# Altium footprint library milandr.PcbLib: 4 footprints
Each footprint in its own frame and in the unit in brackets; x right, y up, seen from the top. Pads: shape width x height; smd on the part's side, far side on the other; paste and mask are expansions set on the pad; w line width, h text height; cw(c..) or ccw(c..) is an arc to the next point about the centre after c.
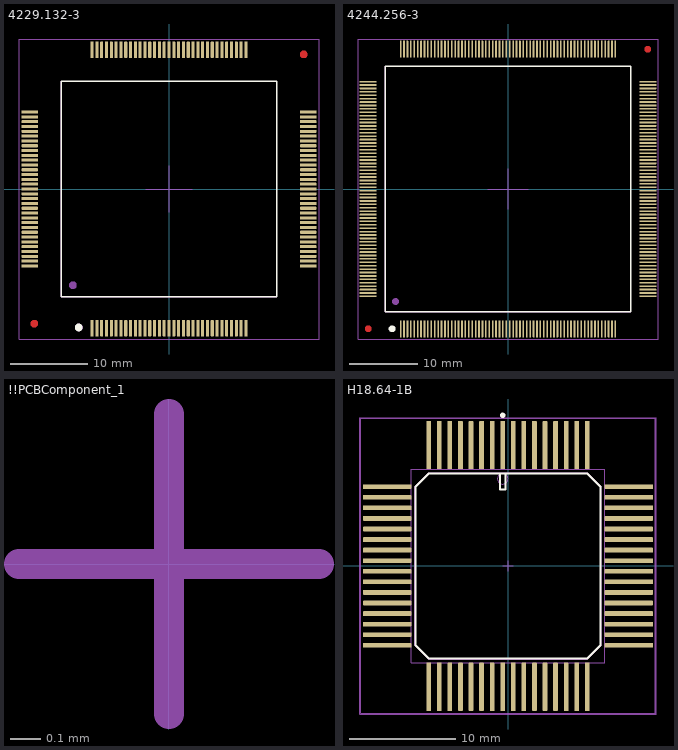
[diagram p0: the footprints below, top view; thin cyan lines are the x and y axes]

## 4229.132-3 [mm] "1986ВЕ1Т_4229.132-3"
height 3.06
pads (132):
  rrect20% 0.4x2.1 smd: 1(-10,-18.1) 2(-9.375,-18.1) 3(-8.75,-18.1) 4(-8.125,-18.1) 5(-7.5,-18.1) 6(-6.875,-18.1) 7(-6.25,-18.1) 8(-5.625,-18.1) 9(-5,-18.1) 10(-4.375,-18.1) 11(-3.75,-18.1) 12(-3.125,-18.1) 13(-2.5,-18.1) 14(-1.875,-18.1) 15(-1.25,-18.1) 16(-0.625,-18.1) 17(0,-18.1) 18(0.625,-18.1) 19(1.25,-18.1) 20(1.875,-18.1) 21(2.5,-18.1) 22(3.125,-18.1) 23(3.75,-18.1) 24(4.375,-18.1) 25(5,-18.1) 26(5.625,-18.1) 27(6.25,-18.1) 28(6.875,-18.1) 29(7.5,-18.1) 30(8.125,-18.1) 31(8.75,-18.1) 32(9.375,-18.1) 33(10,-18.1) 67(10,18.1) 68(9.375,18.1) 69(8.75,18.1) 70(8.125,18.1) 71(7.5,18.1) 72(6.875,18.1) 73(6.25,18.1) 74(5.625,18.1) 75(5,18.1) 76(4.375,18.1) 77(3.75,18.1) 78(3.125,18.1) 79(2.5,18.1) 80(1.875,18.1) 81(1.25,18.1) 82(0.625,18.1) 83(0,18.1) 84(-0.625,18.1) 85(-1.25,18.1) 86(-1.875,18.1) 87(-2.5,18.1) 88(-3.125,18.1) 89(-3.75,18.1) 90(-4.375,18.1) 91(-5,18.1) 92(-5.625,18.1) 93(-6.25,18.1) 94(-6.875,18.1) 95(-7.5,18.1) 96(-8.125,18.1) 97(-8.75,18.1) 98(-9.375,18.1) 99(-10,18.1)
  rrect20% 2.1x0.4 smd: 34(18.1,-10) 35(18.1,-9.375) 36(18.1,-8.75) 37(18.1,-8.125) 38(18.1,-7.5) 39(18.1,-6.875) 40(18.1,-6.25) 41(18.1,-5.625) 42(18.1,-5) 43(18.1,-4.375) 44(18.1,-3.75) 45(18.1,-3.125) 46(18.1,-2.5) 47(18.1,-1.875) 48(18.1,-1.25) 49(18.1,-0.625) 50(18.1,0) 51(18.1,0.625) 52(18.1,1.25) 53(18.1,1.875) 54(18.1,2.5) 55(18.1,3.125) 56(18.1,3.75) 57(18.1,4.375) 58(18.1,5) 59(18.1,5.625) 60(18.1,6.25) 61(18.1,6.875) 62(18.1,7.5) 63(18.1,8.125) 64(18.1,8.75) 65(18.1,9.375) 66(18.1,10) 100(-18.1,10) 101(-18.1,9.375) 102(-18.1,8.75) 103(-18.1,8.125) 104(-18.1,7.5) 105(-18.1,6.875) 106(-18.1,6.25) 107(-18.1,5.625) 108(-18.1,5) 109(-18.1,4.375) 110(-18.1,3.75) 111(-18.1,3.125) 112(-18.1,2.5) 113(-18.1,1.875) 114(-18.1,1.25) 115(-18.1,0.625) 116(-18.1,0) 117(-18.1,-0.625) 118(-18.1,-1.25) 119(-18.1,-1.875) 120(-18.1,-2.5) 121(-18.1,-3.125) 122(-18.1,-3.75) 123(-18.1,-4.375) 124(-18.1,-5) 125(-18.1,-5.625) 126(-18.1,-6.25) 127(-18.1,-6.875) 128(-18.1,-7.5) 129(-18.1,-8.125) 130(-18.1,-8.75) 131(-18.1,-9.375) 132(-18.1,-10)
Top Layer:
  circle w0.5: c-17.5,-17.5 r0.25
  circle w0.5: c17.5,17.5 r0.25
Top Overlay:
  circle w0.5: c-11.75,-18 r0.25
  lines w0.2: -14,-14 14,-14 14,14 -14,14 -14,-14
Top Solder:
  circle w1: c17.5,17.5 r0.5
  circle w1: c-17.5,-17.5 r0.5
M3_comm_top:
  text ".comment" at -1.7,-0.2 h1
M5_asm_top:
  circle w0.2: c-11.7,-18 r0.4
  lines w0.1: -14,-14 14,-14 14,14 -14,14 -14,-14
  text ".Designator" at -1.2,19.5 h1
M7_courtyard_top:
  lines w0.1: -0.5,0 0.5,0 ; 0,-0.5 0,0.5 ; -19.5,-19.5 -19.5,19.5 19.5,19.5 19.5,-19.5 -19.5,-19.5
Mechanical 13:
  circle w0.5: c-12.5,-12.5 r0.25
  lines w0.1: -14,-14 -14,14 14,14 14,-14 -14,-14
Mechanical 15:
  lines w0.1: -3,0 3,0 ; 0,-3 0,3 ; -19.5,-19.5 -19.5,19.5 19.5,19.5 19.5,-19.5 -19.5,-19.5
3D body "4229.132-3(Удлинненые ноги+логотип миландра).STEP": height 4.52, standoff 0, extent -18.5,-18.5 18.5,18.5

## 4244.256-3 [mm] "1986BE8T"
height 3.06
pads (256):
  rrect20% 0.25x2.5 smd: 1(-15.75,-20.5) 2(-15.25,-20.5) 3(-14.75,-20.5) 4(-14.25,-20.5) 5(-13.75,-20.5) 6(-13.25,-20.5) 7(-12.75,-20.5) 8(-12.25,-20.5) 9(-11.75,-20.5) 10(-11.25,-20.5) 11(-10.75,-20.5) 12(-10.25,-20.5) 13(-9.75,-20.5) 14(-9.25,-20.5) 15(-8.75,-20.5) 16(-8.25,-20.5) 17(-7.75,-20.5) 18(-7.25,-20.5) 19(-6.75,-20.5) 20(-6.25,-20.5) 21(-5.75,-20.5) 22(-5.25,-20.5) 23(-4.75,-20.5) 24(-4.25,-20.5) 25(-3.75,-20.5) 26(-3.25,-20.5) 27(-2.75,-20.5) 28(-2.25,-20.5) 29(-1.75,-20.5) 30(-1.25,-20.5) 31(-0.75,-20.5) 32(-0.25,-20.5) 33(0.25,-20.5) 34(0.75,-20.5) 35(1.25,-20.5) 36(1.75,-20.5) 37(2.25,-20.5) 38(2.75,-20.5) 39(3.25,-20.5) 40(3.75,-20.5) 41(4.25,-20.5) 42(4.75,-20.5) 43(5.25,-20.5) 44(5.75,-20.5) 45(6.25,-20.5) 46(6.75,-20.5) 47(7.25,-20.5) 48(7.75,-20.5) 49(8.25,-20.5) 50(8.75,-20.5) 51(9.25,-20.5) 52(9.75,-20.5) 53(10.25,-20.5) 54(10.75,-20.5) 55(11.25,-20.5) 56(11.75,-20.5) 57(12.25,-20.5) 58(12.75,-20.5) 59(13.25,-20.5) 60(13.75,-20.5) 61(14.25,-20.5) 62(14.75,-20.5) 63(15.25,-20.5) 64(15.75,-20.5) 129(15.75,20.5) 130(15.25,20.5) 131(14.75,20.5) 132(14.25,20.5) 133(13.75,20.5) 134(13.25,20.5) 135(12.75,20.5) 136(12.25,20.5) 137(11.75,20.5) 138(11.25,20.5) 139(10.75,20.5) 140(10.25,20.5) 141(9.75,20.5) 142(9.25,20.5) 143(8.75,20.5) 144(8.25,20.5) 145(7.75,20.5) 146(7.25,20.5) 147(6.75,20.5) 148(6.25,20.5) 149(5.75,20.5) 150(5.25,20.5) 151(4.75,20.5) 152(4.25,20.5) 153(3.75,20.5) 154(3.25,20.5) 155(2.75,20.5) 156(2.25,20.5) 157(1.75,20.5) 158(1.25,20.5) 159(0.75,20.5) 160(0.25,20.5) 161(-0.25,20.5) 162(-0.75,20.5) 163(-1.25,20.5) 164(-1.75,20.5) 165(-2.25,20.5) 166(-2.75,20.5) 167(-3.25,20.5) 168(-3.75,20.5) 169(-4.25,20.5) 170(-4.75,20.5) 171(-5.25,20.5) 172(-5.75,20.5) 173(-6.25,20.5) 174(-6.75,20.5) 175(-7.25,20.5) 176(-7.75,20.5) 177(-8.25,20.5) 178(-8.75,20.5) 179(-9.25,20.5) 180(-9.75,20.5) 181(-10.25,20.5) 182(-10.75,20.5) 183(-11.25,20.5) 184(-11.75,20.5) 185(-12.25,20.5) 186(-12.75,20.5) 187(-13.25,20.5) 188(-13.75,20.5) 189(-14.25,20.5) 190(-14.75,20.5) 191(-15.25,20.5) 192(-15.75,20.5)
  rrect20% 2.5x0.25 smd: 65(20.5,-15.75) 66(20.5,-15.25) 67(20.5,-14.75) 68(20.5,-14.25) 69(20.5,-13.75) 70(20.5,-13.25) 71(20.5,-12.75) 72(20.5,-12.25) 73(20.5,-11.75) 74(20.5,-11.25) 75(20.5,-10.75) 76(20.5,-10.25) 77(20.5,-9.75) 78(20.5,-9.25) 79(20.5,-8.75) 80(20.5,-8.25) 81(20.5,-7.75) 82(20.5,-7.25) 83(20.5,-6.75) 84(20.5,-6.25) 85(20.5,-5.75) 86(20.5,-5.25) 87(20.5,-4.75) 88(20.5,-4.25) 89(20.5,-3.75) 90(20.5,-3.25) 91(20.5,-2.75) 92(20.5,-2.25) 93(20.5,-1.75) 94(20.5,-1.25) 95(20.5,-0.75) 96(20.5,-0.25) 97(20.5,0.25) 98(20.5,0.75) 99(20.5,1.25) 100(20.5,1.75) 101(20.5,2.25) 102(20.5,2.75) 103(20.5,3.25) 104(20.5,3.75) 105(20.5,4.25) 106(20.5,4.75) 107(20.5,5.25) 108(20.5,5.75) 109(20.5,6.25) 110(20.5,6.75) 111(20.5,7.25) 112(20.5,7.75) 113(20.5,8.25) 114(20.5,8.75) 115(20.5,9.25) 116(20.5,9.75) 117(20.5,10.25) 118(20.5,10.75) 119(20.5,11.25) 120(20.5,11.75) 121(20.5,12.25) 122(20.5,12.75) 123(20.5,13.25) 124(20.5,13.75) 125(20.5,14.25) 126(20.5,14.75) 127(20.5,15.25) 128(20.5,15.75) 193(-20.5,15.75) 194(-20.5,15.25) 195(-20.5,14.75) 196(-20.5,14.25) 197(-20.5,13.75) 198(-20.5,13.25) 199(-20.5,12.75) 200(-20.5,12.25) 201(-20.5,11.75) 202(-20.5,11.25) 203(-20.5,10.75) 204(-20.5,10.25) 205(-20.5,9.75) 206(-20.5,9.25) 207(-20.5,8.75) 208(-20.5,8.25) 209(-20.5,7.75) 210(-20.5,7.25) 211(-20.5,6.75) 212(-20.5,6.25) 213(-20.5,5.75) 214(-20.5,5.25) 215(-20.5,4.75) 216(-20.5,4.25) 217(-20.5,3.75) 218(-20.5,3.25) 219(-20.5,2.75) 220(-20.5,2.25) 221(-20.5,1.75) 222(-20.5,1.25) 223(-20.5,0.75) 224(-20.5,0.25) 225(-20.5,-0.25) 226(-20.5,-0.75) 227(-20.5,-1.25) 228(-20.5,-1.75) 229(-20.5,-2.25) 230(-20.5,-2.75) 231(-20.5,-3.25) 232(-20.5,-3.75) 233(-20.5,-4.25) 234(-20.5,-4.75) 235(-20.5,-5.25) 236(-20.5,-5.75) 237(-20.5,-6.25) 238(-20.5,-6.75) 239(-20.5,-7.25) 240(-20.5,-7.75) 241(-20.5,-8.25) 242(-20.5,-8.75) 243(-20.5,-9.25) 244(-20.5,-9.75) 245(-20.5,-10.25) 246(-20.5,-10.75) 247(-20.5,-11.25) 248(-20.5,-11.75) 249(-20.5,-12.25) 250(-20.5,-12.75) 251(-20.5,-13.25) 252(-20.5,-13.75) 253(-20.5,-14.25) 254(-20.5,-14.75) 255(-20.5,-15.25) 256(-20.5,-15.75)
Top Layer:
  circle w0.5: c-20.5,-20.5 r0.25
  circle w0.5: c20.5,20.5 r0.25
Top Overlay:
  circle w0.5: c-17,-20.5 r0.25
  circle w0.5: c-17,-20.5 r0.25
  lines w0.2: -18,-18 -18,18 18,18 18,-18 -18,-18
Top Solder:
  circle w1: c-20.5,-20.5 r0.5
  circle w1: c20.5,20.5 r0.5
M3_comm_top:
  text ".comment" at -1.7,-0.2 h1
M5_asm_top:
  circle w0.2: c-17,-20.5 r0.316
  lines w0.1: -18,-18 -18,18 18,18 18,-18 -18,-18
  text ".Designator" at -1.5,22.2 h1
M7_courtyard_top:
  lines w0.1: -0.5,0 0.5,0 ; 0,-0.5 0,0.5 ; -22,-22 22,-22 22,22 -22,22 -22,-22
Mechanical 13:
  circle w0.5: c-16.5,-16.5 r0.25
  lines w0.1: -18,-18 18,-18 18,18 -18,18 -18,-18
Mechanical 15:
  lines w0.1: -3,0 3,0 ; 0,-3 0,3 ; -22,-22 22,-22 22,22 -22,22 -22,-22
3D body "4244_256-3.step": height 3.26, standoff 0, extent -21.382,-21.417 21.418,21.383

## !!PCBComponent_1 [mm]
M3_comm_top:
  text ".comment" at -3,-0.5 h2
M5_asm_top:
  text ".Designator" at -2,5.5 h2
M7_courtyard_top:
  lines w0.1: -0.5,0 0.5,0 ; 0,-0.5 0,0.5

## H18.64-1B [mm] "1986ВЕ92У, CQFP, 64-Leads, Body 26,60x26,60mm, Pitch 1,00mm, IPC Medium Density"
height 3
pads (64):
  rrect20% 0.45x4.55 smd: 1(-0.5,11.425) 2(-1.5,11.425) 3(-2.5,11.425) 4(-3.5,11.425) 5(-4.5,11.425) 6(-5.5,11.425) 7(-6.5,11.425) 8(-7.5,11.425) 25(-7.5,-11.425) 26(-6.5,-11.425) 27(-5.5,-11.425) 28(-4.5,-11.425) 29(-3.5,-11.425) 30(-2.5,-11.425) 31(-1.5,-11.425) 32(-0.5,-11.425) 33(0.5,-11.425) 34(1.5,-11.425) 35(2.5,-11.425) 36(3.5,-11.425) 37(4.5,-11.425) 38(5.5,-11.425) 39(6.5,-11.425) 40(7.5,-11.425) 57(7.5,11.425) 58(6.5,11.425) 59(5.5,11.425) 60(4.5,11.425) 61(3.5,11.425) 62(2.5,11.425) 63(1.5,11.425) 64(0.5,11.425)
  rrect20% 4.55x0.45 smd: 9(-11.425,7.5) 10(-11.425,6.5) 11(-11.425,5.5) 12(-11.425,4.5) 13(-11.425,3.5) 14(-11.425,2.5) 15(-11.425,1.5) 16(-11.425,0.5) 17(-11.425,-0.5) 18(-11.425,-1.5) 19(-11.425,-2.5) 20(-11.425,-3.5) 21(-11.425,-4.5) 22(-11.425,-5.5) 23(-11.425,-6.5) 24(-11.425,-7.5) 41(11.425,-7.5) 42(11.425,-6.5) 43(11.425,-5.5) 44(11.425,-4.5) 45(11.425,-3.5) 46(11.425,-2.5) 47(11.425,-1.5) 48(11.425,-0.5) 49(11.425,0.5) 50(11.425,1.5) 51(11.425,2.5) 52(11.425,3.5) 53(11.425,4.5) 54(11.425,5.5) 55(11.425,6.5) 56(11.425,7.5)
Top Overlay:
  circle w0.25: c-0.5,14.25 r0.125
  lines w0.2: -0.75,8.75 -0.75,7.25 -0.25,7.25 -0.25,8.75 ; -8.75,-7.5 -7.5,-8.75 7.5,-8.75 8.75,-7.5 8.75,7.5 7.5,8.75 -7.5,8.75 -8.75,7.5 -8.75,-7.5
M2_SD_BOT:
  circle w0.1: c-0.5,8.25 r0.5
  lines w0.1: -9.15,-9.15 9.15,-9.15 9.15,9.15 -9.15,9.15 -9.15,-9.15
M3_comm_top:
  text ".comment" at -1.7,-0.2 h1
M4_comm_bot:
  lines w0.05: -13.95,-13.95 13.95,-13.95 13.95,13.95 -13.95,13.95 -13.95,-13.95
  lines w0.1: -0.5,0 0.5,0 ; 0,-0.5 0,0.5
M5_asm_top:
  circle w0.2: c-0.5,14.2 r0.1
  lines w0.1: -8.8,-7.5 -8.8,7.5 -7.5,8.8 7.5,8.8 8.8,7.5 8.8,-7.5 7.5,-8.8 -7.5,-8.8 -8.8,-7.5
  text ".Designator" at 2.2,14.2 h1
M7_courtyard_top:
  lines w0.1: -0.5,0 0.5,0 ; 0,-0.5 0,0.5 ; -14,-14 -14,14 14,14 14,-14 -14,-14
M10_aux:
  text ".comment" at -2.775,-2.125 h1.2
3D body "Миландр. STEP-модель для корпуса Н18.64-1В.STEP": height 2.93, standoff 0.08, extent -12.725,-12.75 12.775,12.75
3D body: height 0.25, standoff 0, extent 19.325,0.075 19.325,0.075